# Altium footprint library GBA.PcbLib: 110 footprints (part 6 of 7)
Each footprint in its own frame and in the unit in brackets; x right, y up, seen from the top. Pads: shape width x height; smd on the part's side, far side on the other; paste and mask are expansions set on the pad; w line width, h text height; cw(c..) or ccw(c..) is an arc to the next point about the centre after c.
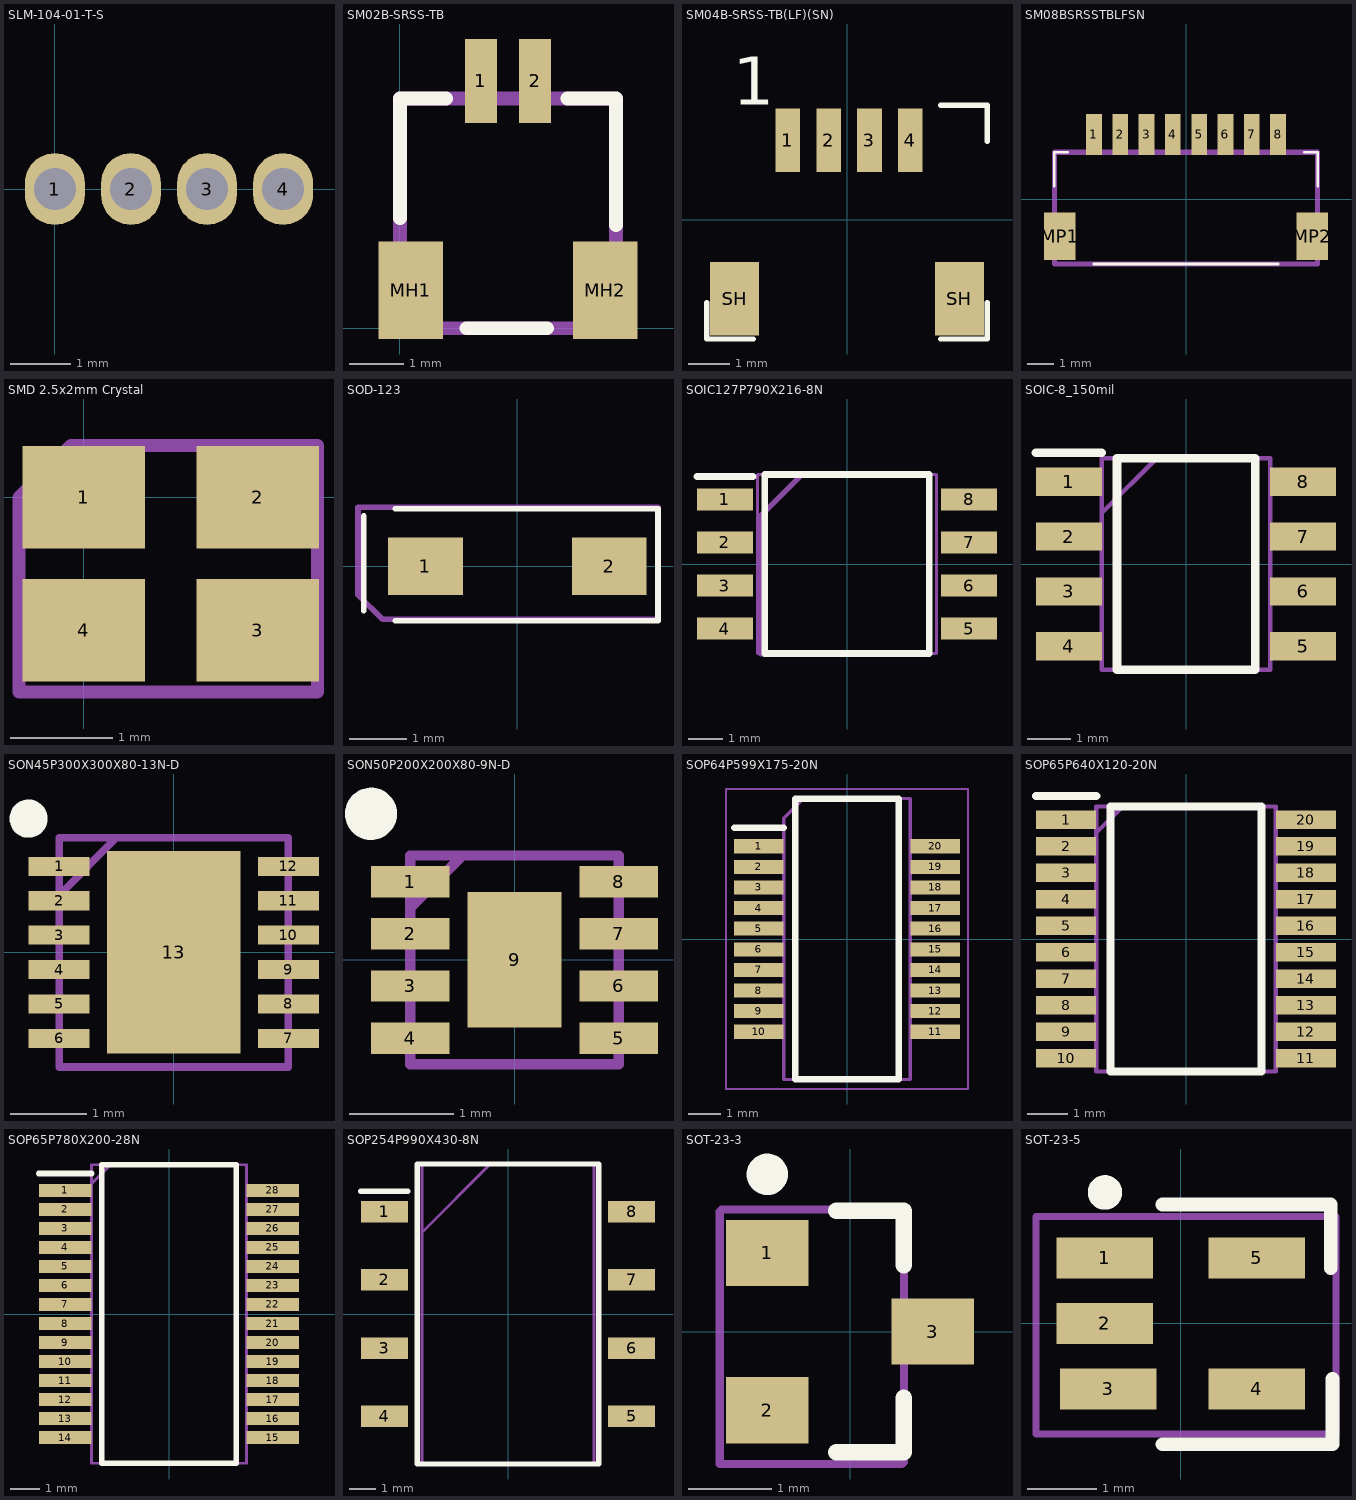
[diagram p5: the footprints below, top view; thin cyan lines are the x and y axes]

## SLM-104-01-T-S [mm]
pads (4):
  oval 1x1.2 hole 0.7: 1(0,0) 2(1.27,0) 3(2.54,0) 4(3.81,0)
Top Designator (Mech29):
  text ".Designator" at -0.127,-0.254 h1
3D body "SLM-104-01-G-S.stp": height 4.57, standoff -2.92, extent -0.749,-1.27 4.559,1.27

## SM02B-SRSS-TB [mm]
pads (4):
  rect 0.6x1.55 smd: 1(1.5,4.575) 2(2.5,4.575)
  rect 1.2x1.8 smd: MH1(0.2,0.7) MH2(3.8,0.7)
Top Overlay:
  lines w0.254: 0,2.037 0,4.25 0.855,4.25 ; 1.233,0 2.722,0 ; 3.1,4.25 4,4.25 4,1.903
Mechanical 13:
  lines w0.254: 0,0 4,0 4,4.25 0,4.25 0,0
Top Designator (Mech29):
  text ".Designator" at 0,2.475 h1
3D body "JST_SM02B-SRSS-TB.step": height 3, standoff 0, extent 0.038,0 4.026,4.987

## SM04B-SRSS-TB(LF)(SN) [mm]
pads (6):
  rect 0.6x1.55 smd: 1(-1.45,1.938) 2(-0.45,1.938) 3(0.55,1.938) 4(1.55,1.938)
  rect 1.2x1.8 smd: SH(-2.75,-1.937) SH(2.75,-1.937)
Top Overlay:
  lines w0.127: -3.429,-2.032 -3.429,-2.921 -2.286,-2.921 ; 2.286,-2.921 3.429,-2.921 3.429,-2.032 ; 2.286,2.794 3.429,2.794 3.429,1.905
  text "1" at -2.794,2.413 h2
3D body "SM04B-SRSS-TB(LF)(SN)--3DModel-STEP-56544.STEP": height 2.96, standoff 0, extent -3,-2.794 3,2.156

## SM08BSRSSTBLFSN [mm]
pads (10):
  rect 0.6x1.55 smd: 1(-3.5,2.463) 2(-2.5,2.463) 3(-1.5,2.463) 4(-0.5,2.463) 5(0.5,2.463) 6(1.5,2.463) 7(2.5,2.463) 8(3.5,2.463)
  rect 1.2x1.8 smd: MP1(-4.8,-1.413) MP2(4.8,-1.413)
Top Overlay:
  lines w0.1: -5,0.5 -5,1.787 -4.5,1.787 ; -3.5,-2.463 3.5,-2.463 ; 4.5,1.787 5,1.787 5,0.5
Mechanical 13:
  lines w0.2: -5,-2.463 -5,1.787 5,1.787 5,-2.463 -5,-2.463
Top Designator (Mech29):
  text ".Designator" at -2.286,-1.27 h1
3D body "SM08B-SRSS-TB(LF)(SN)--3DModel-STEP-56544.STEP": height 3, standoff 0.05, extent -5,-2.032 5,2.918

## SMD 2.5x2mm Crystal [mm]
pads (4):
  rect 1.2x1 smd: 1(0,0) 2(1.7,0) 3(1.7,-1.3) 4(0,-1.3)
Top Designator:
  lines w0.127: -0.635,-1.905 -0.635,0 -0.127,0.508 2.286,0.508 2.286,-1.905 -0.635,-1.905
  text ".Designator" at -0.508,-1.016 h1
3D body "User Library-SM2520-4.step": height 0.8, standoff -0.03, extent -0.361,-1.635 2.139,0.365

## SOD-123 [mm]
pads (2):
  rect 1.3x1 smd: 1(-1.6,0) 2(1.6,0)
Top Overlay:
  lines w0.1: -2.675,-0.775 -2.675,0.875 ; -2.125,-0.95 2.45,-0.95 2.45,1 -2.125,1
Top Designator (Mech29):
  lines w0.1: -2.775,-0.5 -2.775,1.025 2.45,1.025 2.45,-0.925 -2.35,-0.925 -2.775,-0.5
  text ".Designator" at -1.8,-0.35 h1
3D body "SOD-123FL.STEP": height 0.95, standoff 0, extent -1.825,-0.825 1.775,0.825

## SOIC127P790X216-8N [mm]
pads (8):
  rect 1.65x0.65 smd: 1(-3.6,1.905) 2(-3.6,0.635) 3(-3.6,-0.635) 4(-3.6,-1.905) 5(3.6,-1.905) 6(3.6,-0.635) 7(3.6,0.635) 8(3.6,1.905)
Top Overlay:
  lines w0.2: -4.425,2.58 -2.775,2.58 ; -2.425,-2.64 -2.425,2.64 2.425,2.64 2.425,-2.64 -2.425,-2.64
Top Designator:
  lines w0.127: -2.54,-2.667 -2.54,1.397 -1.27,2.667 2.413,2.667 2.413,-2.667 -2.54,-2.667
  text ".Designator" at -1.905,-0.573 h1
Mechanical 13:
  lines w0.1: -2.64,1.37 -1.37,2.64 ; -2.64,-2.64 -2.64,2.64 2.64,2.64 2.64,-2.64 -2.64,-2.64
3D body "W25Q16JVSSIQ.stp": height 2.16, standoff 0, extent -3.95,-2.64 3.95,2.64

## SOIC-8_150mil [mm]
pads (8):
  rect 1.525x0.65 smd: 1(-2.712,1.905) 2(-2.712,0.635) 3(-2.712,-0.635) 4(-2.712,-1.905) 5(2.712,-1.905) 6(2.712,-0.635) 7(2.712,0.635) 8(2.712,1.905)
Top Overlay:
  lines w0.2: -3.475,2.58 -1.95,2.58 ; -1.6,-2.45 -1.6,2.45 1.6,2.45 1.6,-2.45 -1.6,-2.45
Top Designator (Mech29):
  lines w0.1: -1.95,1.18 -0.68,2.45 ; -1.95,-2.45 1.95,-2.45 1.95,2.45 -1.95,2.45 -1.95,-2.45
  text ".Designator" at 48.78,-36.605 h1
3D body "NE555DR.stp": height 1.75, standoff 0, extent -3,-2.45 3,2.45

## SON45P300X300X80-13N-D [mm]
pads (13):
  rect 0.8x0.25 smd: 1(-1.5,1.125) 2(-1.5,0.675) 3(-1.5,0.225) 4(-1.5,-0.225) 5(-1.5,-0.675) 6(-1.5,-1.125) 7(1.5,-1.125) 8(1.5,-0.675) 9(1.5,-0.225) 10(1.5,0.225) 11(1.5,0.675) 12(1.5,1.125)
  rect 1.75x2.65 smd: 13(0,0)
Top Overlay:
  circle w0.25: c-1.9,1.75 r0.125
Top Designator (Mech29):
  lines w0.1: -1.5,0.75 -0.75,1.5 ; -1.5,-1.5 -1.5,1.5 1.5,1.5 1.5,-1.5 -1.5,-1.5
  text ".Designator" at -1.143,-0.635 h1
3D body "RT8020AGQW.stp": height 0.8, standoff 0, extent -1.55,-1.5 1.55,1.5

## SON50P200X200X80-9N-D [mm]
pads (9):
  rect 0.75x0.3 smd: 1(-1,0.75) 2(-1,0.25) 3(-1,-0.25) 4(-1,-0.75) 5(1,-0.75) 6(1,-0.25) 7(1,0.25) 8(1,0.75)
  rect 0.9x1.3 smd: 9(0,0)
Top Overlay:
  circle w0.25: c-1.375,1.4 r0.125
Top Designator:
  lines w0.1: -1,0.5 -0.5,1 ; -1,-1 -1,1 1,1 1,-1 -1,-1
  text ".Designator" at -0.889,-0.635 h1
3D body "MAX98300ETA+T.stp": height 0.8, standoff 0, extent -1.05,-1 1.05,1

## SOP64P599X175-20N [mm]
pads (20):
  rect 1.526x0.435 smd: 1(-2.712,2.858) 2(-2.712,2.222) 3(-2.712,1.588) 4(-2.712,0.952) 5(-2.712,0.318) 6(-2.712,-0.318) 7(-2.712,-0.952) 8(-2.712,-1.588) 9(-2.712,-2.222) 10(-2.712,-2.858) 11(2.712,-2.858) 12(2.712,-2.222) 13(2.712,-1.588) 14(2.712,-0.952) 15(2.712,-0.318) 16(2.712,0.318) 17(2.712,0.952) 18(2.712,1.588) 19(2.712,2.222) 20(2.712,2.858)
Top Overlay:
  lines w0.2: -3.475,3.425 -1.95,3.425 ; -1.6,-4.324 1.6,-4.324 1.6,4.324 -1.6,4.324 -1.6,-4.324
Mechanical 20:
  lines w0.05: -3.725,-4.619 3.725,-4.619 3.725,4.619 -3.725,4.619 -3.725,-4.619
Top Designator (Mech29):
  lines w0.1: -1.95,-4.324 -1.95,3.72 -1.346,4.324 1.95,4.324 1.95,-4.324 -1.95,-4.324
  text ".Designator" at 0.254,-3.429 h0.8
3D body "FT231XS-R.stp": height 1.75, standoff 0, extent -2.997,-4.324 2.997,4.325

## SOP65P640X120-20N [mm]
pads (20):
  rect 1.475x0.45 smd: 1(-2.938,2.925) 2(-2.938,2.275) 3(-2.938,1.625) 4(-2.938,0.975) 5(-2.938,0.325) 6(-2.938,-0.325) 7(-2.938,-0.975) 8(-2.938,-1.625) 9(-2.938,-2.275) 10(-2.938,-2.925) 11(2.938,-2.925) 12(2.938,-2.275) 13(2.938,-1.625) 14(2.938,-0.975) 15(2.938,-0.325) 16(2.938,0.325) 17(2.938,0.975) 18(2.938,1.625) 19(2.938,2.275) 20(2.938,2.925)
Top Overlay:
  lines w0.2: -3.675,3.5 -2.2,3.5 ; -1.85,-3.25 -1.85,3.25 1.85,3.25 1.85,-3.25 -1.85,-3.25
Top Designator (Mech29):
  lines w0.1: -2.2,2.6 -1.55,3.25 ; -2.2,-3.25 2.2,-3.25 2.2,3.25 -2.2,3.25 -2.2,-3.25
  text ".Designator" at -1.905,-0.381 h1
3D body "PCM5102APWR.stp": height 1.2, standoff 0, extent -3.2,-3.25 3.2,3.25

## SOP65P780X200-28N [mm]
pads (28):
  rect 1.8x0.45 smd: 1(-3.55,4.225) 2(-3.55,3.575) 3(-3.55,2.925) 4(-3.55,2.275) 5(-3.55,1.625) 6(-3.55,0.975) 7(-3.55,0.325) 8(-3.55,-0.325) 9(-3.55,-0.975) 10(-3.55,-1.625) 11(-3.55,-2.275) 12(-3.55,-2.925) 13(-3.55,-3.575) 14(-3.55,-4.225) 15(3.55,-4.225) 16(3.55,-3.575) 17(3.55,-2.925) 18(3.55,-2.275) 19(3.55,-1.625) 20(3.55,-0.975) 21(3.55,-0.325) 22(3.55,0.325) 23(3.55,0.975) 24(3.55,1.625) 25(3.55,2.275) 26(3.55,2.925) 27(3.55,3.575) 28(3.55,4.225)
Top Overlay:
  lines w0.2: -4.45,4.8 -2.65,4.8 ; -2.3,-5.1 2.3,-5.1 2.3,5.1 -2.3,5.1 -2.3,-5.1
Top Designator:
  lines w0.1: -2.65,4.45 -2,5.1 ; -2.65,-5.1 2.65,-5.1 2.65,5.1 -2.65,5.1 -2.65,-5.1
  text ".Designator" at 0.065,-1.905 h1
3D body "PCM2704CDBR.stp": height 1.9, standoff 0, extent -3.9,-5.1 3.9,5.1

## SOP254P990X430-8N [mm]
pads (8):
  rect 1.75x0.8 smd: 1(-4.6,3.81) 2(-4.6,1.27) 3(-4.6,-1.27) 4(-4.6,-3.81) 5(4.6,-3.81) 6(4.6,-1.27) 7(4.6,1.27) 8(4.6,3.81)
Top Overlay:
  lines w0.2: -5.475,4.56 -3.725,4.56 ; -3.375,-5.58 -3.375,5.58 3.375,5.58 3.375,-5.58 -3.375,-5.58
Top Designator:
  lines w0.1: -3.2,3.04 -0.66,5.58 ; -3.2,-5.58 3.2,-5.58 3.2,5.58 -3.2,5.58 -3.2,-5.58
  text ".Designator" at -0.57,-1.397 h1
3D body "CUI_DEVICES_DS04-254-2-04BK-SMT.step": height -0.39, standoff -4.39, extent -4.696,-5.572 5.204,5.588

## SOT-23-3 [mm] "SOT23, 3-Leads, Body 2.92x1.3mm, Pitch 0.95mm"
height 1.11
pads (3):
  rect 1x0.8 smd: 1(-1,0.95) 2(-1,-0.95) 3(1,0)
Top Overlay:
  circle w0.25: c-1,1.9 r0.125
  lines w0.2: -0.165,-1.46 0.65,-1.46 0.65,-0.8 ; -0.165,1.46 0.65,1.46 0.65,0.8
Top Designator (Mech29):
  lines w0.1: -1.575,-1.6 0.625,-1.6 0.65,-1.575 0.65,1.475 -1.55,1.475 -1.575,1.45 -1.575,-1.6
  text ".Designator" at -0.8,1.125 h1
3D body "SOT23-3.step": height 1.3, standoff 0, extent -1.4,-1.45 1.4,1.45

## SOT-23-5 [mm] "SOT23, 3-Leads, Body 2.92x1.3mm, Pitch 0.95mm"
height 1.11
pads (5):
  rect 1.4x0.6 smd: 1(-1.1,0.95) 2(-1.1,0) 3(-1.05,-0.95) 4(1.1,-0.95) 5(1.1,0.95)
Top Overlay:
  circle w0.25: c-1.1,1.9 r0.125
  lines w0.2: -0.265,-1.75 2.2,-1.75 2.2,-0.8 ; -0.265,1.725 2.175,1.725 2.175,0.8
Top Designator (Mech29):
  lines w0.1: -2.1,-1.6 -2.1,1.55 2.25,1.55 2.25,-1.6 -2.1,-1.6
  text ".Designator" at -0.9,1.125 h1
3D body "SOT-23-5.step": height 1.05, standoff -0.05, extent -1.175,-1.5 1.325,1.5